# Altium footprint library Sirius.PcbLib: 58 footprints (part 1 of 4)
Each footprint in its own frame and in the unit in brackets; x right, y up, seen from the top. Pads: shape width x height; smd on the part's side, far side on the other; paste and mask are expansions set on the pad; w line width, h text height; cw(c..) or ccw(c..) is an arc to the next point about the centre after c.
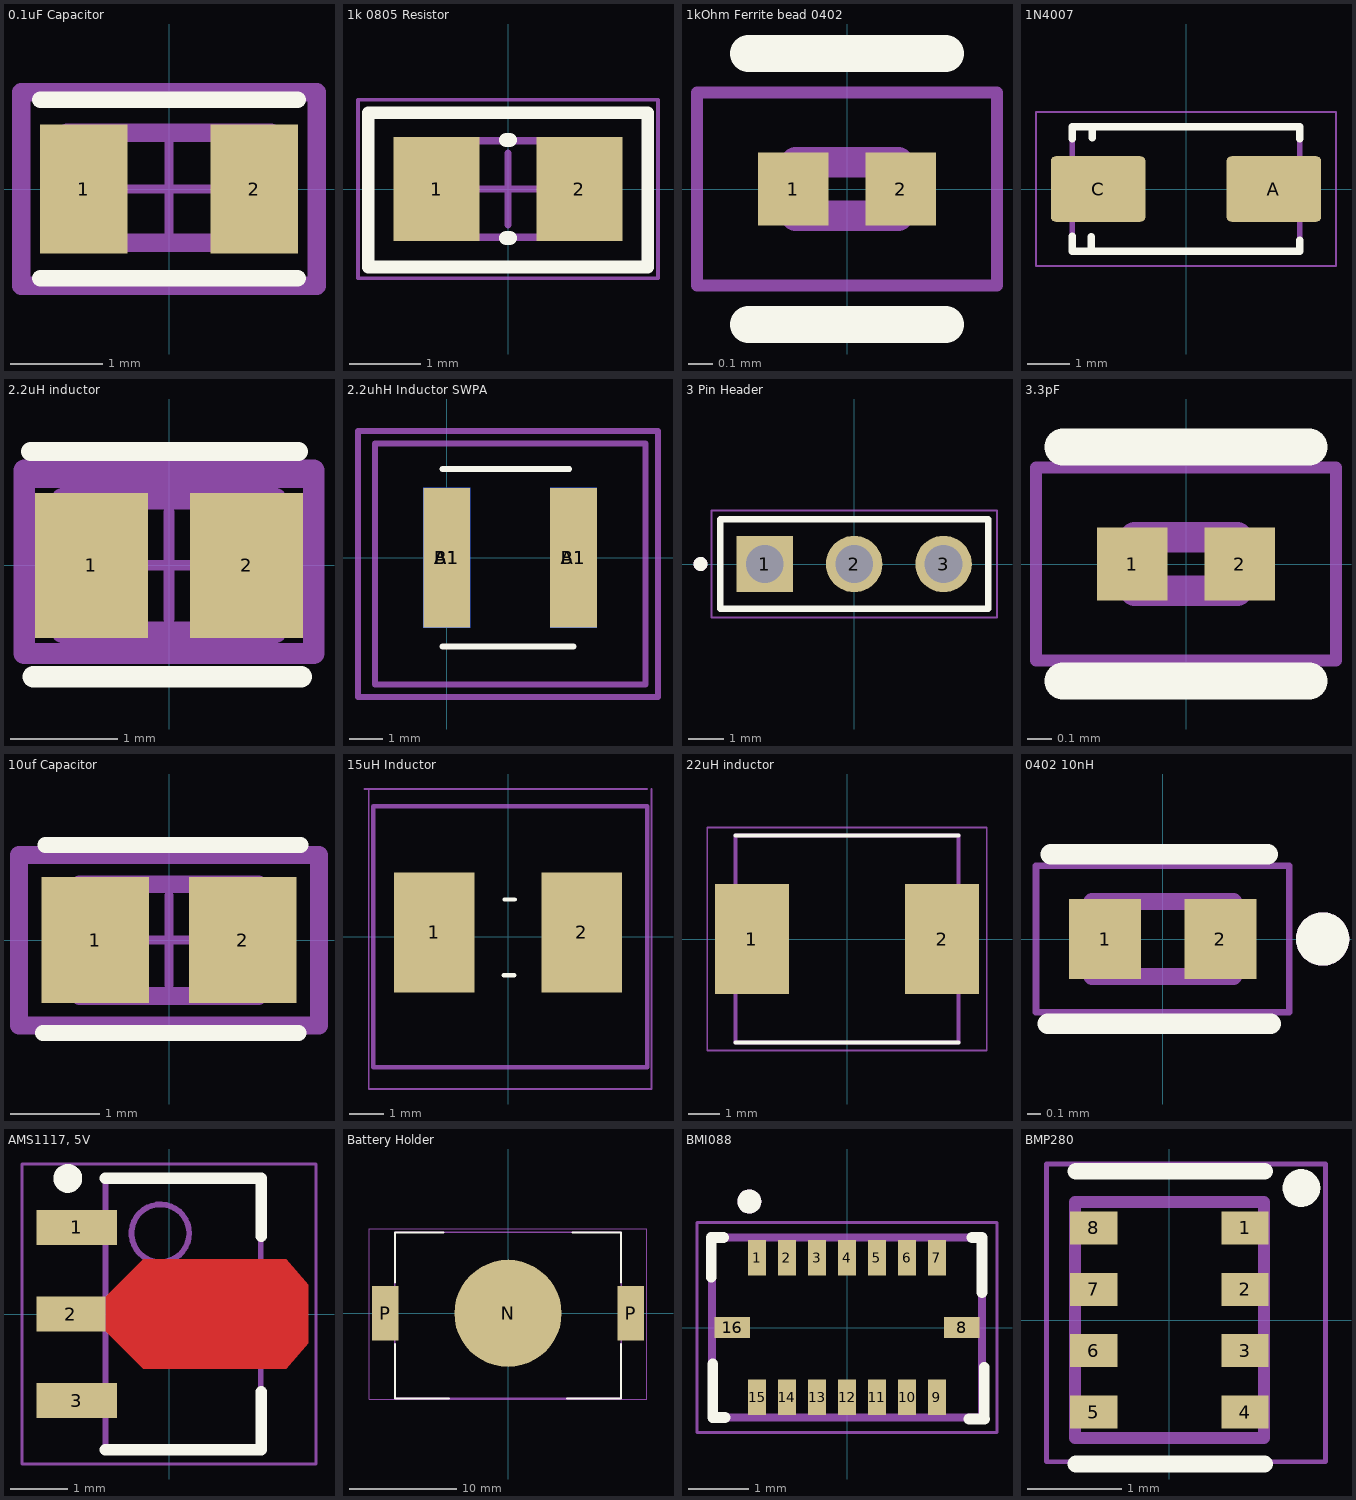
[diagram p0: the footprints below, top view; thin cyan lines are the x and y axes]

## 0.1uF Capacitor [mm] "0.1uf/100nf, FP-CC0805-0_85-MFG"
pads (2):
  rect 0.95x1.4 smd paste+0 mask+0: 1(-0.925,0) 2(0.925,0)
Top Overlay:
  lines w0.178: -1.397,-0.965 1.397,-0.965 ; -1.397,0.965 1.397,0.965
Top 3D Body:
  lines w0.2: -1.1,-0.584 -1.1,0.61 1.1,0.61 1.1,-0.584 -1.1,-0.584
Top Courtyard:
  lines w0.2: -1.6,-1.05 -1.6,1.05 1.6,1.05 1.6,-1.05 -1.6,-1.05
Top Assembly:
  lines w0.2: -1.6,-1.05 -1.6,1.05 1.6,1.05 1.6,-1.05 -1.6,-1.05
Top Component Center:
  lines w0.1: -0.5,0 0.5,0 ; 0,-0.5 0,0.5
3D body "Cap_Yageo_CC0805KKX7R7BB105_eec.STEP": height 0.25, standoff 0, extent -1.6,-1.05 1.6,1.05

## 1k 0805 Resistor [mm] "0805 Chip Resistor, 2-Leads, Body 2.1x1.35mm, IPC Low Density"
height 0.6
pads (2):
  rect 1.2x1.45 smd: 1(-1,0) 2(1,0)
Top Overlay:
  lines w0.178: -1.956,-1.092 1.956,-1.092 1.956,1.067 -1.956,1.067 -1.956,-1.092
  lines w0.2: -0.025,-0.686 0.025,-0.686 ; -0.025,0.686 0.025,0.686
Mechanical 13:
  lines w0.1: -1.05,-0.675 1.05,-0.675 1.05,0.675 -1.05,0.675 -1.05,-0.675
Mechanical 15:
  lines w0.05: -2.1,-1.25 2.1,-1.25 2.1,1.25 -2.1,1.25 -2.1,-1.25
  lines w0.1: -0.5,0 0.5,0 ; 0,-0.5 0,0.5
3D body "RESC2012X06N.step": height 0.6, standoff 0, extent -1.05,-0.675 1.05,0.675

## 1kOhm Ferrite bead 0402 [mm] "GZ1005U102CTF-SUNLORD-580mΩ ±25% 1kΩ@100MHz 0402 Ferrite Beads ROHS"
pads (2):
  rect 0.29x0.3 smd: 1(-0.222,0) 2(0.222,0)
Top Overlay:
  lines w0.152: -0.406,-0.559 0.406,-0.559 ; -0.406,0.559 0.406,0.559
Mechanical 13:
  lines w0.127: -0.21,-0.11 0.21,-0.11 0.21,0.11 -0.21,0.11 -0.21,-0.11
Mechanical 15:
  lines w0.05: -0.619,-0.399 0.619,-0.399 0.619,0.399 -0.619,0.399 -0.619,-0.399
3D body "step_temp.STEP": height 0.22, standoff 0, extent -0.2,-0.1 0.2,0.1

## 1N4007 [mm]
pads (2):
  rrect15% 2.21x1.53 smd: A(2.05,0) C(-2.05,0)
Top Overlay:
  lines w0.178: -2.65,-1.1 -2.65,-1.45 2.65,-1.45 2.65,-1.194 ; -2.65,1.168 -2.65,1.45 2.65,1.45 2.65,1.168 ; -2.21,-1.422 -2.21,-1.118 ; -2.184,1.194 -2.184,1.422
Mechanical 13:
  lines w0.127: -2.65,-1.45 -2.65,1.45 2.65,1.45 2.65,-1.45 -2.65,-1.45
Mechanical 15:
  lines w0.05: -3.5,-1.8 3.5,-1.8 3.5,1.8 -3.5,1.8 -3.5,-1.8
3D body "M7 1N4007.STEP": height 2.2, standoff 0, extent -2.5,-1.35 2.5,1.35

## 2.2uH inductor [mm]
pads (2):
  rect 1.055x1.356 smd paste+0 mask+0: 1(-0.726,0) 2(0.726,0)
Top Overlay:
  lines w0.178: -1.295,1.067 1.211,1.067
  lines w0.2: -1.27,-1.041 1.236,-1.041
Top 3D Body:
  lines w0.2: -1,-0.625 1,-0.625 1,0.625 -1,0.625 -1,-0.625
Top Courtyard:
  lines w0.178: -1.353,-0.825 1.353,-0.825
  lines w0.2: -1.353,-0.825 -1.353,0.889 1.353,0.889 1.353,-0.825
Top Assembly:
  lines w0.2: -1.353,-0.825 1.353,-0.825 1.353,0.825 -1.353,0.825 -1.353,-0.825
Top Component Center:
  lines w0.1: -0.5,0 0.5,0 ; 0,-0.5 0,0.5
3D body "Ind_Murata_LQM21PZ1R0MC0D_eec.STEP": height 0.25, standoff 0, extent -1.353,-0.825 1.353,0.825

## 2.2uhH Inductor SWPA [mm]
pads (6):
  rect 1.4x4.2 smd: A1(0,0) A1(0,0) A1(3.81,0)
  rect 1.4x4.2 smd far side: B1(0,0) B1(0,0) B1(3.81,0)
Top Overlay:
  lines w0.178: -0.127,-2.667 3.81,-2.667 ; -0.127,2.667 3.683,2.667
Mechanical 13:
  lines w0.127: -1.778,3.429 5.969,3.429 5.969,-3.81
  lines w0.178: -2.159,-3.81 5.969,-3.81 5.969,3.429 -2.159,3.429 -2.159,-3.81
Mechanical 15:
  lines w0.178: -2.667,-4.191 -2.667,3.81 6.35,3.81 6.35,-4.191 -2.667,-4.191
3D body "Inductor_SMD_AMPLF_0650.STEP": height 5.01, standoff 0, extent -1.77,-3.502 5.53,3.198

## 3 Pin Header [mm]
pads (3):
  rect 1.605x1.605 / inner round 1.605 / far side rect 1.605x1.605 hole 1.07: 1(-2.54,0)
  round 1.605 hole 1.07: 2(0,0) 3(2.54,0)
Top Overlay:
  circle w0.2: c-4.37,0 r0.1
  lines w0.178: -3.81,-1.27 3.81,-1.27 3.81,1.27 -3.81,1.27 -3.81,-1.27
Mechanical 13:
  circle w0.2: c-4.37,0 r0.1
  lines w0.127: -3.81,-1.27 3.81,-1.27 3.81,1.27 -3.81,1.27 -3.81,-1.27
Mechanical 15:
  lines w0.05: -4.06,-1.52 4.06,-1.52 4.06,1.52 -4.06,1.52 -4.06,-1.52
3D body "step_temp.STEP": height 7.37, standoff -4.27, extent -3.81,-1.27 3.81,1.27

## 3.3pF [mm] "0402"
pads (2):
  rect 0.29x0.3 smd: 1(-0.222,0) 2(0.222,0)
Top Overlay:
  lines w0.152: -0.508,-0.483 0.508,-0.483 ; -0.508,0.483 0.508,0.483
Mechanical 13:
  lines w0.127: -0.21,-0.11 -0.21,0.11 0.21,0.11 0.21,-0.11 -0.21,-0.11
Mechanical 15:
  lines w0.05: -0.619,-0.399 -0.619,0.399 0.619,0.399 0.619,-0.399 -0.619,-0.399
3D body "step_temp.STEP": height 0.22, standoff 0, extent -0.2,-0.1 0.2,0.1

## 10uf Capacitor [mm]
pads (2):
  rect 1.206x1.408 smd paste+0 mask+0: 1(-0.826,0) 2(0.826,0)
Top Overlay:
  lines w0.178: -1.41,-1.041 1.448,-1.041 ; -1.385,1.067 1.473,1.067
Top 3D Body:
  lines w0.2: -1,-0.625 1,-0.625 1,0.625 -1,0.625 -1,-0.625
Top Courtyard:
  lines w0.2: -1.679,-0.954 1.679,-0.954 1.679,0.954 -1.679,0.954 -1.679,-0.954
Top Assembly:
  lines w0.2: -1.679,-0.954 1.679,-0.954 1.679,0.954 -1.679,0.954 -1.679,-0.954
Top Component Center:
  lines w0.1: -0.5,0 0.5,0 ; 0,-0.5 0,0.5
3D body "Cap_Murata_GRM21BC81C106KA73L_eec.STEP": height 0.25, standoff 0, extent -1.679,-0.954 1.679,0.954

## 15uH Inductor [mm] "MWSA0605"
pads (2):
  rect 2.35x3.5 smd: 1(-2.159,0.127) 2(2.159,0.127)
Top Overlay:
  lines w0.127: -0.122,-1.118 0.178,-1.118 ; -0.102,1.092 0.198,1.092
Mechanical 13:
  lines w0.127: -3.937,-3.81 4.064,-3.81 4.064,3.81 -3.937,3.81 -3.937,-3.81
Mechanical 15:
  lines w0.05: -4.191,4.318 4.064,4.318 ; -4.064,4.318 -4.064,-4.445 4.191,-4.445 4.191,4.318
3D body "Inductor_SMD_AMPLF_0650.STEP": height 5.01, standoff 0, extent -3.65,-3.223 3.65,3.477

## 22uH inductor [mm] "ASPI-0630LR-150M-T15"
height 3
pads (2):
  rect 2.35x3.5 smd: 1(-3.025,0) 2(3.025,0)
Top Overlay:
  lines w0.127: -3.55,-3.3 3.55,-3.3 ; -3.55,3.3 3.55,3.3
Mechanical 13:
  lines w0.127: -3.55,-3.3 3.55,-3.3 3.55,3.3 -3.55,3.3 -3.55,-3.3
Mechanical 15:
  lines w0.05: -4.45,-3.55 4.45,-3.55 4.45,3.55 -4.45,3.55 -4.45,-3.55
3D body "step_temp.STEP": height 1.35, standoff -1.65, extent -3.6,-3.325 3.6,3.325

## 0402 10nH [mm] "0402 10nH, INDC1005X55N"
pads (2):
  rect 0.54x0.6 smd: 1(-0.432,0) 2(0.432,0)
Top Overlay:
  circle w0.2: c1.2,0 r0.1
  lines w0.152: -0.864,-0.635 0.813,-0.635 ; -0.838,0.635 0.787,0.635
Mechanical 13:
  circle w0.2: c1.2,0 r0.1
  lines w0.127: -0.53,-0.28 0.53,-0.28 0.53,0.28 -0.53,0.28 -0.53,-0.28
Mechanical 15:
  lines w0.05: -0.95,-0.55 0.95,-0.55 0.95,0.55 -0.95,0.55 -0.95,-0.55
3D body "0402 10nH.STEP": height 0.55, standoff 0, extent -0.5,-0.25 0.5,0.25

## AMS1117, 5V [mm] "SOT89"
pads (3):
  rect 1.4x0.6 smd: 1(-1.6,1.5) 3(-1.6,-1.5)
  rect 1.2x0.6 smd: 2(-1.7,0)
Top Layer:
  region: -1.1,0.3 -0.45,0.95 2.032,0.95 2.413,0.508 2.413,-0.508 2.032,-0.95 -0.45,-0.95 -1.1,-0.3
Top Overlay:
  circle w0.25: c-1.755,2.35 r0.125
  lines w0.2: -1.105,-2.35 1.595,-2.35 1.595,-1.35 ; -1.105,2.35 1.595,2.35 1.595,1.35
Top Courtyard:
  lines w0.05: -2.55,-2.6 2.55,-2.6 2.55,2.6 -2.55,2.6 -2.55,-2.6
  lines w0.1: -0.255,0 0.745,0 ; 0.245,-0.5 0.245,0.5
Top Assembly:
  circle w0.1: c-0.15,1.4 r0.5
  lines w0.1: -1.1,-2.35 1.59,-2.35 1.59,2.35 -1.1,2.35 -1.1,-2.35
3D body "SOT89-150P350X160-3N.step": height 1.6, standoff 0, extent -2.246,-2.349 1.954,2.349

## Battery Holder [mm]
pads (3):
  round 10 smd paste-10: N(0,0)
  rect 2.5x5.1 smd: P(-11.45,0) P(11.45,0)
Top Overlay:
  lines w0.178: -10.55,-2.87 -10.55,-7.95 -5.5,-7.95 ; -10.55,2.87 -10.55,7.55 -6,7.55 ; 5.5,-7.95 10.55,-7.95 10.55,-2.87 ; 6,7.55 10.55,7.55 10.55,2.87
Mechanical 13:
  lines w0.127: -10.55,-7.95 -10.55,7.55 10.55,7.55 10.55,-7.95 -10.55,-7.95
Mechanical 15:
  lines w0.05: -12.95,-8.001 -12.95,7.874 12.95,7.874 12.95,-8.001 -12.95,-8.001
3D body "step_temp.STEP": height 2.79, standoff 0, extent -11.43,-7.747 11.43,7.747

## BMI088 [mm] "IMU 6DOF"
pads (16):
  rect 0.3x0.59 smd: 1(-1.5,1.165) 2(-1,1.165) 3(-0.5,1.165) 4(0,1.165) 5(0.5,1.165) 6(1,1.165) 7(1.5,1.165) 9(1.5,-1.165) 10(1,-1.165) 11(0.5,-1.165) 12(0,-1.165) 13(-0.5,-1.165) 14(-1,-1.165) 15(-1.5,-1.165)
  rect 0.59x0.35 smd: 8(1.915,0) 16(-1.915,0)
Top Overlay:
  circle w0.2: c-1.629,2.1 r0.1
  lines w0.178: -2.261,0.838 -2.261,1.5 -2.057,1.5 ; -2.235,-0.61 -2.235,-1.5 -2.032,-1.5 ; 2.032,-1.525 2.292,-1.525 2.286,-1.515 2.286,-0.66 ; 2.083,1.5 2.25,1.5 2.25,0.584
Mechanical 13:
  circle w0.2: c-1.629,2.1 r0.1
  lines w0.127: -2.25,-1.5 -2.25,1.5 2.25,1.5 2.25,-1.5 -2.25,-1.5
Mechanical 15:
  lines w0.05: -2.5,-1.75 -2.5,1.75 2.5,1.75 2.5,-1.75 -2.5,-1.75
3D body "BMI088.step": height 1, standoff 0, extent -2.25,-1.5 2.25,1.5

## BMP280 [mm] "BMP280"
pads (8):
  rect 0.5x0.35 smd: 1(0.8,0.975) 2(0.8,0.325) 3(0.8,-0.325) 4(0.8,-0.975) 5(-0.8,-0.975) 6(-0.8,-0.325) 7(-0.8,0.325) 8(-0.8,0.975)
Top Overlay:
  circle w0.2: c1.397,1.397 r0.1
  lines w0.178: -0.991,-1.524 1.009,-1.524 ; -0.991,1.575 1.009,1.575
Mechanical 13:
  lines w0.127: -1,-1.25 -1,1.25 1,1.25 1,-1.25 -1,-1.25
Mechanical 15:
  lines w0.05: -1.3,-1.5 1.651,-1.5 1.651,1.651 -1.3,1.651 -1.3,-1.5
3D body "BMP280.step": height 1, standoff 0, extent -1,-1.25 1,1.25